# Altium footprint library 2228_AlarmeFenetre_Footprints.PcbLib: 12 footprints
Each footprint in its own frame and in the unit in brackets; x right, y up, seen from the top. Pads: shape width x height; smd on the part's side, far side on the other; paste and mask are expansions set on the pad; w line width, h text height; cw(c..) or ccw(c..) is an arc to the next point about the centre after c.
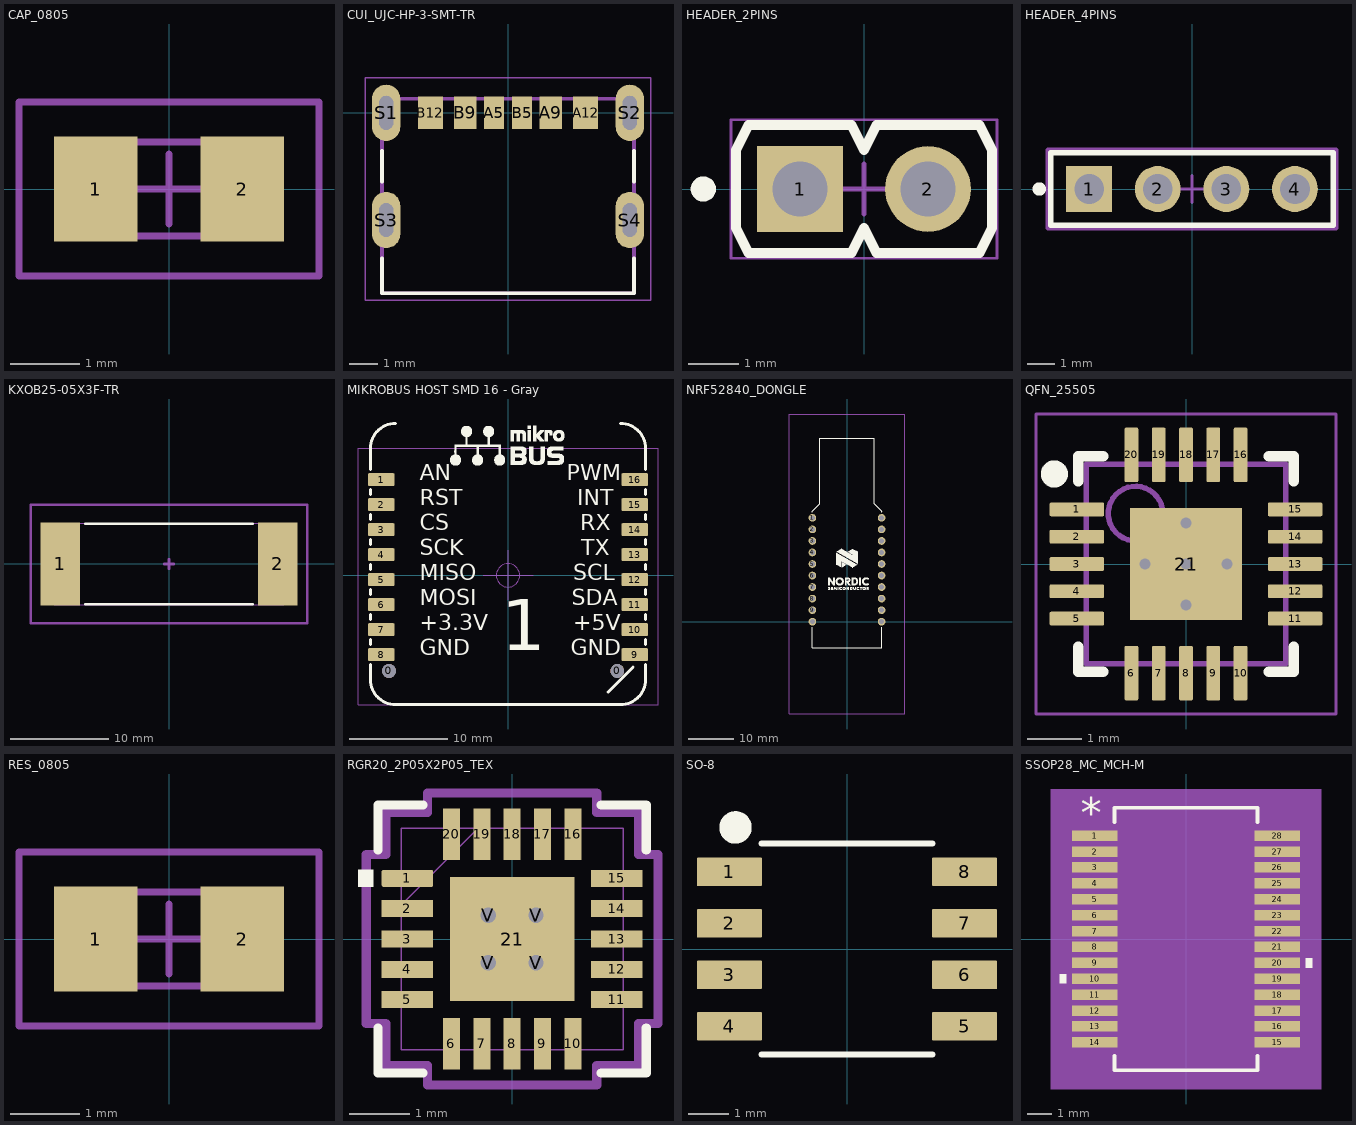
[diagram p0: the footprints below, top view; thin cyan lines are the x and y axes]

## CAP_0805 [mm]
height 1.4
pads (2):
  rect 1.2x1.5 smd: 1(-1.05,0) 2(1.05,0)
Mechanical 13:
  lines w0.1: -1.075,-0.675 1.075,-0.675 1.075,0.675 -1.075,0.675 -1.075,-0.675
Mechanical 15:
  lines w0.1: -0.5,0 0.5,0 ; 0,-0.5 0,0.5 ; -2.15,-1.25 2.15,-1.25 2.15,1.25 -2.15,1.25 -2.15,-1.25
3D body "Ceramic_Capacitor_0805_h32mil.step": height 0.81, standoff 0.01, extent -1,-0.625 1,0.625

## CUI_UJC-HP-3-SMT-TR [mm]
pads (10):
  rect 0.7x1.15 smd: A5(-0.5,0.005) B5(0.5,0.005)
  rect 0.8x1.15 smd: A9(1.52,0.005) B9(-1.52,0.005)
  rect 0.9x1.15 smd: A12(2.75,0.005) B12(-2.75,0.005)
  oval 1x2 hole 0.5 slot 1.2 at 90 deg: S1(-4.32,0) S2(4.32,0) S3(-4.32,-3.8) S4(4.32,-3.8)
Top Overlay:
  lines w0.127: -4.47,-5.15 -4.47,-6.4 4.47,-6.4 4.47,-5.15 ; -4.47,-2.45 -4.47,-1.35 ; 4.47,-2.45 4.47,-1.35
Mechanical 13:
  lines w0.127: -4.47,-6.4 4.47,-6.4 4.47,0.5 -4.47,0.5 -4.47,-6.4
Mechanical 15:
  lines w0.05: -5.07,-6.65 5.07,-6.65 5.07,1.25 -5.07,1.25 -5.07,-6.65
3D body "CUI_DEVICES_UJC-HP-3-SMT-TR.step": height 0.63, standoff -3.63, extent -4.47,-6.381 4.47,0.519

## HEADER_2PINS [mm] "Header, 2-Leads, Body 5.08x2.54mm, Pitch 2.54mm"
height 8.54
pads (2):
  rect 1.7x1.7 hole 1.1: 1(-1.27,0)
  round 1.7 hole 1.1: 2(1.27,0)
Top Overlay:
  circle w0.25: c-3.19,0 r0.125
  lines w0.2: -2.54,-0.77 -2.54,0.77 -2.29,1.27 -0.25,1.27 0,0.77 0.25,1.27 2.29,1.27 2.54,0.77 2.54,-0.77 2.29,-1.27 0.25,-1.27 0,-0.77 -0.25,-1.27 -2.29,-1.27 -2.54,-0.77
Mechanical 13:
  lines w0.1: -2.54,-0.77 -2.29,-1.27 -0.25,-1.27 0,-0.77 0.25,-1.27 2.29,-1.27 2.54,-0.77 2.54,0.77 2.29,1.27 0.25,1.27 0,0.77 -0.25,1.27 -2.29,1.27 -2.54,0.77 -2.54,-0.77
Mechanical 15:
  lines w0.05: -2.64,-1.37 2.64,-1.37 2.64,1.37 -2.64,1.37 -2.64,-1.37
  lines w0.1: -0.5,0 0.5,0 ; 0,-0.5 0,0.5
3D body "STEP-61300211121-rev1.stp": height 8.54, standoff -3, extent -2.54,-1.27 2.54,1.27

## HEADER_4PINS [mm]
pads (4):
  rect 1.7x1.7 hole 1.1: 1(-3.81,0)
  round 1.7 hole 1.1: 2(-1.27,0) 3(1.27,0) 4(3.81,0)
Top Overlay:
  circle w0.25: c-5.655,0 r0.125
  lines w0.2: -5.23,-1.345 -5.23,1.345 5.23,1.345 5.23,-1.345 -5.23,-1.345
Mechanical 10:
  lines w0.2: -5.33,-1.445 -5.33,1.445 5.33,1.445 5.33,-1.445 -5.33,-1.445
Mechanical 12:
  lines w0.15: -5.23,-1.345 -5.23,1.345 5.23,1.345 5.23,-1.345 -5.23,-1.345
Mechanical 15:
  lines w0.1: -0.5,0 0.5,0 ; 0,-0.5 0,0.5
  lines w0.2: -5.33,-1.445 -5.33,1.445 5.33,1.445 5.33,-1.445 -5.33,-1.445
3D body "Conn_Wurth_61300411121_eec.STEP": height 0.25, standoff 0, extent -5.33,-1.445 5.33,1.445

## KXOB25-05X3F-TR [mm] "Solar Panel, 2-Leads, Body 23,00x8,00mm, IPC Low Density"
height 2.1
pads (2):
  rect 4x8.4 smd: 1(-11,0) 2(11,0)
Top Overlay:
  lines w0.254: -8.5,-4.1 8.5,-4.1 ; -8.5,4.1 8.5,4.1
Mechanical 13:
  lines w0.1: -11.65,-4.15 -11.65,4.15 11.65,4.15 11.65,-4.15 -11.65,-4.15
Mechanical 15:
  lines w0.254: -0.5,0 0.5,0 ; 0,-0.5 0,0.5 ; -14,-6 14,-6 14,6 -14,6 -14,-6
3D body "Anysolar_KXOB25.step": height 1.9, standoff 0, extent -11.5,-4 11.5,4

## MIKROBUS HOST SMD 16 - Gray [mm]
height 3.16
pads (18):
  round 1.4 hole 1.4 unplated: 0(-12.094,-9.703) 0(11.106,-9.703)
  rrect20% 2.7x1.3 smd mask+0.076: 1(-12.88,9.728) 2(-12.88,7.188) 3(-12.88,4.648) 4(-12.88,2.108) 5(-12.88,-0.432) 6(-12.88,-2.972) 7(-12.88,-5.512) 8(-12.88,-8.052) 9(12.88,-8.052) 10(12.88,-5.512) 11(12.88,-2.972) 12(12.88,-0.432) 13(12.88,2.108) 14(12.88,4.648) 15(12.88,7.188) 16(12.88,9.728)
Top Overlay:
  drawing of 2451 lines, arcs and shapes, not listed
  text "1" at -0.705,-9.322 h8.89
  text "SDA" at 6.463,-3.607 h2.79
  text "RST" at -8.951,6.553 h2.79
  text "CS" at -8.953,4.013 h2.79
  text "MISO" at -8.953,-1.067 h2.79
  text "SCK" at -8.953,1.473 h2.79
  text "MOSI" at -8.953,-3.607 h2.79
  text "+3.3V" at -8.951,-6.147 h2.79
  text "GND" at -8.953,-8.687 h2.79
  text "SCL" at 6.649,-1.067 h2.79
  text "INT" at 7.016,6.553 h2.79
  text "RX" at 7.324,4.013 h2.79
  text "TX" at 7.456,1.473 h2.79
  text "GND" at 6.375,-8.687 h2.79
  text "+5V" at 6.639,-6.147 h2.79
  text "AN" at -8.951,9.093 h2.79
  text "PWM" at 5.984,9.093 h2.79
Mechanical 15:
  circle w0.051: c0,0 r1.191
  circle w0.051: c0,0 r1.191
  lines w0.051: -15.24,-13.132 -15.24,12.903 15.24,12.903 15.24,-13.132 -15.24,-13.132 ; -2.54,0 2.54,0 -2.54,0 ; 0,-2.54 0,2.54 0,-2.54
3D body "mikroBUS_SMD_Gray.stp": height 11.01, standoff -1.19, extent -13.716,-11.862 13.744,11.032

## NRF52840_DONGLE [mm]
pads (20):
  round 1.7 hole 1.1: 1(-7.62,22.86) 2(-7.62,20.32) 3(-7.62,17.78) 4(-7.62,15.24) 5(-7.62,12.7) 6(-7.62,10.16) 7(-7.62,7.62) 8(-7.62,5.08) 9(-7.62,2.54) 10(-7.62,0) 11(7.62,0) 12(7.62,2.54) 13(7.62,5.08) 14(7.62,7.62) 15(7.62,10.16) 16(7.62,12.7) 17(7.62,15.24) 18(7.62,17.78) 19(7.62,20.32) 20(7.62,22.86)
Top Overlay:
  drawing of 33 lines, arcs and shapes, not listed
Mechanical 15:
  lines w0.254: -12.7,-20.32 12.7,-20.32 12.7,45.72 -12.7,45.72 -12.7,-20.32
3D body "61301011821.stp": height 5.8, standoff -4.65, extent 4.244,-10 10.996,10
3D body "61301011821.stp": height 5.8, standoff -4.65, extent -10.996,-10 -4.244,10
3D body "400250.step": height 15.5, standoff 10.93, extent -7.62,-5.588 7.62,40.451
3D body "Conn_Wurth_Elektronik_61301011121_eec.STEP": height 14.27, standoff 2.53, extent 6.347,-1.27 8.89,24.13
3D body "Conn_Wurth_Elektronik_61301011121_eec.STEP": height 14.27, standoff 2.53, extent -8.893,-1.27 -6.35,24.13

## QFN_25505 [mm] "QFN, 20-Leads, Body 3,65x3,65mm, Pitch 0,50mm, Thermal Pad 2,05x2,05mm, IPC Low Density"
height 1
pads (21):
  rrect20% 1x0.25 smd mask+0.07: 1(-2,1) 2(-2,0.5) 3(-2,0) 4(-2,-0.5) 5(-2,-1) 11(2,-1) 12(2,-0.5) 13(2,0) 14(2,0.5) 15(2,1)
  rrect20% 0.25x1 smd mask+0.07: 6(-1,-2) 7(-0.5,-2) 8(0,-2) 9(0.5,-2) 10(1,-2) 16(1,2) 17(0.5,2) 18(0,2) 19(-0.5,2) 20(-1,2)
  rect 2.05x2.05 smd: 21(0,0)
via 0,0 diameter 0.5 hole 0.2
via -0.75,0 diameter 0.5 hole 0.2
via 0,0.75 diameter 0.5 hole 0.2
via 0,-0.75 diameter 0.5 hole 0.2
via 0.75,0 diameter 0.5 hole 0.2
Top Overlay:
  circle w0.25: c-2.413,1.651 r0.125
  lines w0.2: -1.975,-1.525 -1.975,-1.975 -1.525,-1.975 ; -1.975,1.525 -1.975,1.975 -1.525,1.975 ; 1.525,-1.975 1.975,-1.975 1.975,-1.525 ; 1.525,1.975 1.975,1.975 1.975,1.525
Top Courtyard:
  lines w0.05: -2.75,-2.75 -2.75,2.75 2.75,2.75 2.75,-2.75 -2.75,-2.75
  lines w0.1: -0.5,0 0.5,0 ; 0,-0.5 0,0.5
Mechanical 13:
  circle w0.1: c-0.925,0.925 r0.5
  lines w0.1: -1.825,-1.825 -1.825,1.825 1.825,1.825 1.825,-1.825 -1.825,-1.825
3D body "RGR20_2P05X2P05_TEX.step": height 1.4, standoff 0, extent -1.88,-1.88 1.88,1.88

## RES_0805 [mm]
height 1.4
pads (2):
  rect 1.2x1.5 smd: 1(-1.05,0) 2(1.05,0)
Mechanical 13:
  lines w0.1: -1.075,-0.675 1.075,-0.675 1.075,0.675 -1.075,0.675 -1.075,-0.675
Mechanical 15:
  lines w0.1: -0.5,0 0.5,0 ; 0,-0.5 0,0.5 ; -2.15,-1.25 2.15,-1.25 2.15,1.25 -2.15,1.25 -2.15,-1.25
3D body "Resistor_0805_Text.step": height 0.52, standoff 0.01, extent -1,-0.625 1,0.625

## RGR20_2P05X2P05_TEX [mm]
pads (25):
  rrect20% 0.85x0.28 smd paste+0 mask+0: 1(-1.725,1)
  rect 0.85x0.28 smd paste+0 mask+0: 2(-1.725,0.5) 3(-1.725,0) 4(-1.725,-0.5) 5(-1.725,-1) 11(1.725,-1) 12(1.725,-0.5) 13(1.725,0) 14(1.725,0.5) 15(1.725,1)
  rect 0.28x0.85 smd paste+0 mask+0: 6(-1,-1.725) 7(-0.5,-1.725) 8(0,-1.725) 9(0.5,-1.725) 10(1,-1.725) 16(1,1.725) 17(0.5,1.725) 18(0,1.725) 19(-0.5,1.725) 20(-1,1.725)
  rect 2.05x2.05 smd paste-1.025 mask-1.016: 21(0,0)
  round 0.508 hole 0.254: V(-0.394,-0.394) V(-0.394,0.394) V(0.394,-0.394) V(0.394,0.394)
Top Overlay:
  region: -2.286,1.143 -2.286,0.864 -2.54,0.864 -2.54,1.143
  lines w0.152: -2.21,-1.467 -2.21,-2.21 -1.468,-2.21 ; -2.21,1.467 -2.21,2.21 -1.468,2.21 ; 1.468,-2.21 2.21,-2.21 2.21,-1.467 ; 1.468,2.21 2.21,2.21 2.21,1.467
Top Paste:
  region: -0.494,0.95 -0.95,0.95 -0.95,0.494 -0.635,0.494 -0.494,0.635
  region: -0.635,0.294 -0.95,0.294 -0.95,-0.294 -0.635,-0.294 -0.494,-0.152 -0.494,0.152
  region: -0.635,-0.494 -0.95,-0.494 -0.95,-0.95 -0.494,-0.95 -0.494,-0.635
  region: 0.294,0.95 -0.294,0.95 -0.294,0.635 -0.152,0.494 0.152,0.494 0.294,0.635
  region: 0.152,0.294 -0.152,0.294 -0.294,0.152 -0.294,-0.152 -0.152,-0.294 0.152,-0.294 0.294,-0.152 0.294,0.152
  region: 0.152,-0.494 -0.152,-0.494 -0.294,-0.635 -0.294,-0.95 0.294,-0.95 0.294,-0.635
  region: 0.95,0.95 0.494,0.95 0.494,0.635 0.635,0.494 0.95,0.494
  region: 0.95,0.294 0.635,0.294 0.494,0.152 0.494,-0.152 0.635,-0.294 0.95,-0.294
  region: 0.95,-0.494 0.635,-0.494 0.494,-0.635 0.494,-0.95 0.95,-0.95
Top Solder:
  region: -1.088,0.594 -1.088,1.088 1.088,1.088 1.088,0.594
  region: -1.088,-0.194 -1.088,0.194 1.088,0.194 1.088,-0.194
  region: -1.088,-1.088 -1.088,-0.594 1.088,-0.594 1.088,-1.088
  region: -1.088,-1.088 -1.088,1.088 -0.594,1.088 -0.594,-1.088
  region: 0.194,-1.088 0.194,1.088 -0.194,1.088 -0.194,-1.088
  region: 0.594,-1.088 0.594,1.088 1.088,1.088 1.088,-1.088
Mechanical 13:
  lines w0.025: -1.829,0.559 -0.559,1.829 ; -1.829,-1.829 1.829,-1.829 1.829,1.829 -1.829,1.829 -1.829,-1.829
Mechanical 15:
  lines w0.152: -2.404,-1.394 -2.083,-1.394 -2.083,-2.083 -1.394,-2.083 -1.394,-2.404 1.394,-2.404 1.394,-2.083 2.083,-2.083 2.083,-1.394 2.404,-1.394 2.404,1.394 2.083,1.394 2.083,2.083 1.394,2.083 1.394,2.404 -1.394,2.404 -1.394,2.083 -2.083,2.083 -2.083,1.394 -2.404,1.394 -2.404,-1.394
3D body "RGR20_2P05X2P05_TEX.step": height 1.4, standoff 0, extent -1.88,-1.88 1.88,1.88

## SO-8 [mm]
height 1.5
pads (8):
  rrect5% 1.6x0.7 smd: 1(-2.9,1.905) 2(-2.9,0.635) 3(-2.9,-0.635) 4(-2.9,-1.905) 5(2.9,-1.905) 6(2.9,-0.635) 7(2.9,0.635) 8(2.9,1.905)
Top Overlay:
  circle w0.4: c-2.75,3 r0.2
  lines w0.152: -2.108,-2.603 2.108,-2.603 ; -2.108,2.603 2.108,2.603
3D body "IC_DMP3028LSD-13_DIO.step": height 1.76, standoff 0, extent -3.05,-2.476 3.05,2.476

## SSOP28_MC_MCH-M [mm]
pads (28):
  rect 1.858x0.431 smd paste+0 mask+0: 1(-3.723,4.225) 2(-3.723,3.575) 3(-3.723,2.925) 4(-3.723,2.275) 5(-3.723,1.625) 6(-3.723,0.975) 7(-3.723,0.325) 8(-3.723,-0.325) 9(-3.723,-0.975) 10(-3.723,-1.625) 11(-3.723,-2.275) 12(-3.723,-2.925) 13(-3.723,-3.575) 14(-3.723,-4.225) 15(3.723,-4.225) 16(3.723,-3.575) 17(3.723,-2.925) 18(3.723,-2.275) 19(3.723,-1.625) 20(3.723,-0.975) 21(3.723,-0.325) 22(3.723,0.325) 23(3.723,0.975) 24(3.723,1.625) 25(3.723,2.275) 26(3.723,2.925) 27(3.723,3.575) 28(3.723,4.225)
Top Overlay:
  region: -4.906,-1.434 -5.16,-1.434 -5.16,-1.815 -4.906,-1.815
  region: 4.906,-0.784 5.16,-0.784 5.16,-1.165 4.906,-1.165
  lines w0.152: -2.921,-4.773 -2.921,-5.372 2.921,-5.372 2.921,-4.773 ; -2.921,4.773 -2.921,5.372 2.921,5.372 2.921,4.773
  text "*" at -4.295,4.529 h1.27
Mechanical 5:
  region: 5.541,-6.134 -5.541,-6.134 -5.541,6.134 5.541,6.134
Mechanical 13:
  lines w0: -0.305,5.245 ccw(c0,5.245) 0.305,5.245
  lines w0.025: -4.102,-4.415 -4.102,-4.034 -2.794,-4.034 -2.794,-4.415 -4.102,-4.415 ; -4.102,-3.765 -4.102,-3.384 -2.794,-3.384 -2.794,-3.765 -4.102,-3.765 ; -4.102,-3.115 -4.102,-2.734 -2.794,-2.734 -2.794,-3.115 -4.102,-3.115 ; -4.102,-2.465 -4.102,-2.084 -2.794,-2.084 -2.794,-2.465 -4.102,-2.465 ; -4.102,-1.815 -4.102,-1.434 -2.794,-1.434 -2.794,-1.815 -4.102,-1.815 ; -4.102,-1.165 -4.102,-0.784 -2.794,-0.784 -2.794,-1.165 -4.102,-1.165 ; -4.102,-0.515 -4.102,-0.134 -2.794,-0.134 -2.794,-0.515 -4.102,-0.515 ; -4.102,0.135 -4.102,0.516 -2.794,0.516 -2.794,0.135 -4.102,0.135 ; -4.102,0.784 -4.102,1.165 -2.794,1.165 -2.794,0.784 -4.102,0.784 ; -4.102,1.435 -4.102,1.816 -2.794,1.816 -2.794,1.435 -4.102,1.435 ; -4.102,2.084 -4.102,2.465 -2.794,2.465 -2.794,2.084 -4.102,2.084 ; -4.102,2.735 -4.102,3.116 -2.794,3.116 -2.794,2.735 -4.102,2.735 ; -4.102,3.384 -4.102,3.765 -2.794,3.765 -2.794,3.384 -4.102,3.384 ; -4.102,4.035 -4.102,4.416 -2.794,4.416 -2.794,4.035 -4.102,4.035 ; -2.794,-5.245 2.794,-5.245 2.794,5.245 -2.794,5.245 -2.794,-5.245 ; 2.794,-4.416 2.794,-4.035 4.102,-4.035 4.102,-4.416 2.794,-4.416 ; 2.794,-3.765 2.794,-3.384 4.102,-3.384 4.102,-3.765 2.794,-3.765 ; 2.794,-3.116 2.794,-2.735 4.102,-2.735 4.102,-3.116 2.794,-3.116 ; 2.794,-2.465 2.794,-2.084 4.102,-2.084 4.102,-2.465 2.794,-2.465 ; 2.794,-1.816 2.794,-1.435 4.102,-1.435 4.102,-1.816 2.794,-1.816 ; 2.794,-1.165 2.794,-0.784 4.102,-0.784 4.102,-1.165 2.794,-1.165 ; 2.794,-0.516 2.794,-0.135 4.102,-0.135 4.102,-0.516 2.794,-0.516 ; 2.794,0.135 2.794,0.516 4.102,0.516 4.102,0.135 2.794,0.135 ; 2.794,0.784 2.794,1.165 4.102,1.165 4.102,0.784 2.794,0.784 ; 2.794,1.435 2.794,1.816 4.102,1.816 4.102,1.435 2.794,1.435 ; 2.794,2.084 2.794,2.465 4.102,2.465 4.102,2.084 2.794,2.084 ; 2.794,2.735 2.794,3.116 4.102,3.116 4.102,2.735 2.794,2.735 ; 2.794,3.384 2.794,3.765 4.102,3.765 4.102,3.384 2.794,3.384 ; 2.794,4.035 2.794,4.416 4.102,4.416 4.102,4.035 2.794,4.035
  text "*" at -2.73,3.899 h1.27
Mechanical 15:
  region: -3.302,-4.948 -5.16,-4.948 -5.16,4.948 -3.302,4.948 -3.302,5.753 3.302,5.753 3.302,4.948 5.16,4.948 5.16,-4.948 3.302,-4.948 3.302,-5.753 -3.302,-5.753
  lines w0.152: -5.16,-4.948 -5.16,4.948 -3.302,4.948 -3.302,5.753 3.302,5.753 3.302,4.948 5.16,4.948 5.16,-4.948 3.302,-4.948 3.302,-5.753 -3.302,-5.753 -3.302,-4.948 -5.16,-4.948
3D body "SSOP28_MC_MCH.step": height 2.01, standoff 0, extent -4.102,-5.245 4.102,5.245